# Altium footprint library Resistors.PcbLib: 93 footprints (part 1 of 6)
Each footprint in its own frame and in the unit in brackets; x right, y up, seen from the top. Pads: shape width x height; smd on the part's side, far side on the other; paste and mask are expansions set on the pad; w line width, h text height; cw(c..) or ccw(c..) is an arc to the next point about the centre after c.
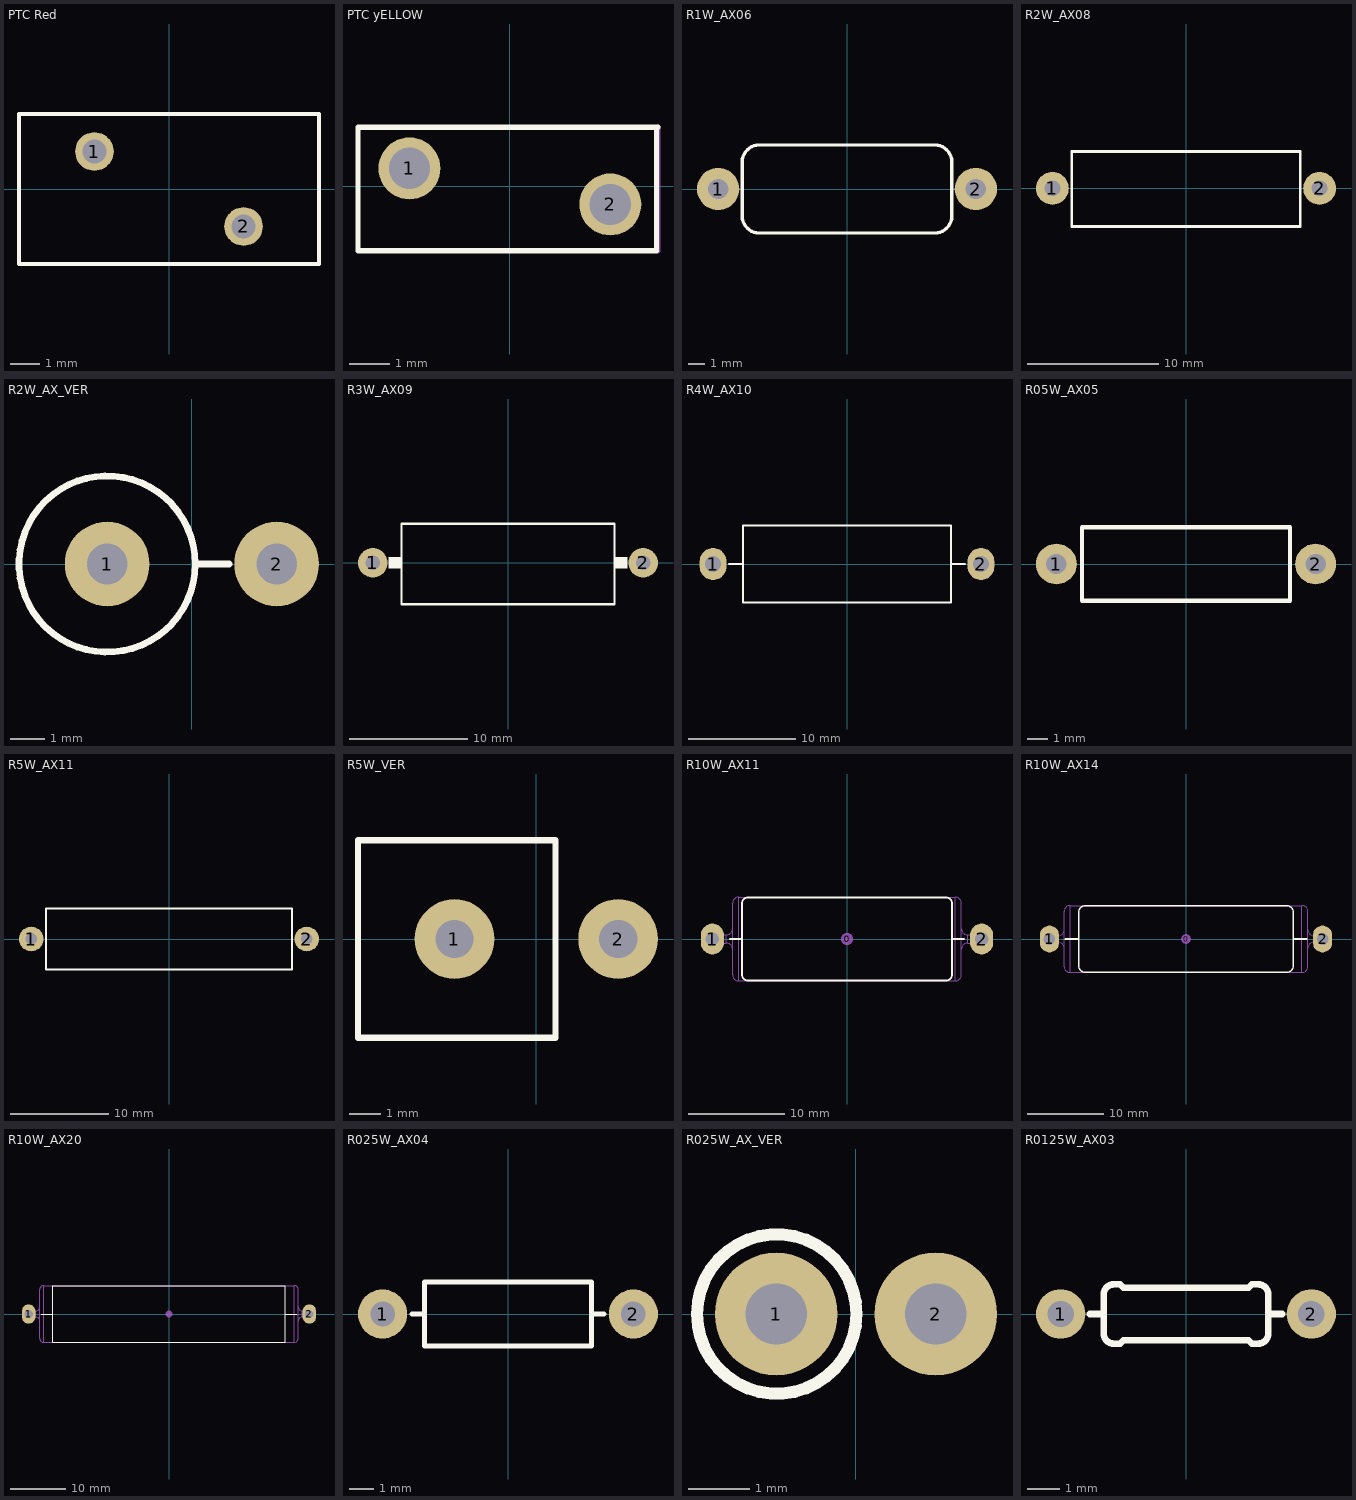
[diagram p0: the footprints below, top view; thin cyan lines are the x and y axes]

## PTC Red [mm]
pads (2):
  round 1.308 hole 0.8: 1(-2.525,1.27) 2(2.525,-1.27)
Top Overlay:
  lines w0.127: -5.08,-2.54 -5.08,2.54 5.08,2.54 5.08,-2.54 -5.08,-2.54
3D body "PTC-RED.step": height 15.3, standoff -25, extent -6.15,-3.3 6.15,3.3

## PTC yELLOW [mm]
pads (2):
  round 1.53 hole 1.02: 1(-2.476,0.445) 2(2.476,-0.445)
Top Overlay:
  lines w0.127: -3.746,1.182 -3.746,-1.587 ; -3.437,1.46 3.619,1.46 3.619,-1.587 -3.746,-1.587 ; 3.654,1.46 -3.746,1.46 -3.746,-1.587
Mechanical 13:
  lines w0.127: 3.654,-1.587 3.654,1.46
3D body "ALSRobot-PTC.step": height 14.81, standoff -3.41, extent -3.747,-0.875 3.653,0.825

## R1W_AX06 [mm] "RESISTOR 1 WATT, AXIAL0.6"
height 5
pads (2):
  round 2.5 hole 1.2: 1(-7.62,0) 2(7.62,0)
Top Overlay:
  lines w0.2: -6.2,-1.6 ccw(c-5.2,-1.6) -5.2,-2.6 5.2,-2.6 ccw(c5.2,-1.6) 6.2,-1.6 6.2,1.6 ccw(c5.2,1.6) 5.2,2.6 -5.2,2.6 ccw(c-5.2,1.6) -6.2,1.6 -6.2,-1.6
3D body "User Library-RES-1W.STEP": height 5, standoff -3, extent -7.97,-2.494 7.97,2.506

## R2W_AX08 [mm] "RESISTOR 2 WATT, AXIAL0.8"
height 5.5
pads (2):
  round 2.5 hole 1.2: 1(-10.16,0) 2(10.16,0)
Top Overlay:
  lines w0.2: -8.7,-2.9 8.7,-2.9 8.7,2.8 -8.7,2.8 -8.7,-2.9
3D body "User Library-RES-2W.STEP": height 5.5, standoff -3, extent -10.51,-2.8 10.51,2.7

## R2W_AX_VER [mm] "RESISTOR 2 WATT, AXIAL0.8"
height 5.5
pads (2):
  round 2.5 hole 1.2: 1(-2.5,0) 2(2.5,0)
Top Overlay:
  circle w0.2: c-2.5,0 r2.6
  lines w0.2: 0.191,0 1.1,0
3D body "User Library-RESAD500W80L1600D500_2W.STEP": height 20.3, standoff -3.1, extent -5,-2.5 2.9,2.5

## R3W_AX09 [mm] "RESISTOR 3 WATT, AXIAL0.9"
height 6.5
pads (2):
  round 2.5 hole 1.2: 1(-11.43,0) 2(11.43,0)
Top Overlay:
  region: 10.1,0.5 9,0.5 9,-0.5 10.1,-0.5
  rectangle: -10.1,-0.5 -9,0.5
  lines w0.2: -9,-3.5 -9,3.3 9,3.3 9,-3.5 -9,-3.5
3D body "User Library-RES-3W.STEP": height 6.5, standoff -3, extent -11.83,-3.3 11.83,3.2

## R4W_AX10 [mm] "RESISTOR 4 WATT, AXIAL1.0"
pads (2):
  oval 2.5x3 hole 1.5: 1(-12.5,0) 2(12.5,0)
Top Overlay:
  lines w0.2: -11,0 -9.7,0 ; 9.7,0 11,0 ; -9.7,-3.6 9.7,-3.6 9.7,3.6 -9.7,3.6 -9.7,-3.6
3D body "User Library-AXIAL_RESISTOR(4W)_HORIZONTAL.step": height 7.21, standoff -3.2, extent -13.1,-3.5 13.1,3.5

## R05W_AX05 [mm] "gRESISTOR 0.5 WATT, AXIAL0.5"
height 3.5
pads (2):
  round 2 hole 1: 1(-6.35,0) 2(6.35,0)
Top Overlay:
  lines w0.2: -5.1,-1.8 5.1,-1.8 5.1,1.8 -5.1,1.8 -5.1,-1.8
3D body "User Library-RES-1_5W.STEP": height 3.5, standoff -3, extent -6.62,-1.75 6.62,1.75

## R5W_AX11 [mm] "RESISTOR 5 WATT, AXIAL1.1"
pads (2):
  round 2.5 hole 1.2: 1(-13.97,0) 2(13.97,0)
Top Overlay:
  lines w0.2: -12.5,-3.1 -12.5,3.1 12.5,3.1 12.5,-3.1 -12.5,-3.1
3D body "User Library-RES-5W.STEP": height 7.01, standoff -5, extent -14.34,-3 14.4,3

## R5W_VER [mm] "RESISTOR 5 WATT, AXIAL1.1"
pads (2):
  round 2.5 hole 1.2: 1(-2.57,0) 2(2.57,0)
Top Overlay:
  lines w0.2: -5.6,-3.1 -5.6,3.1 0.6,3.1 0.6,-3.1 -5.6,-3.1
3D body "User Library-RES-5W-Vert.STEP": height 26.85, standoff -2.75, extent -5.54,-3.006 2.94,3.009

## R10W_AX11 [mm] "RESISTOR 10 WATT, AXIAL1.1"
height 8.712
pads (3):
  round 1.27 on Mech15: 0(0,0)
  oval 2.4x3.2 hole 1.4: 1(-14,0) 2(14,0)
Top Overlay:
  lines w0.2: -12.192,0 -10.922,0 ; 10.922,0 12.192,0 ; -10.922,-3.683 ccw(c-10.287,-3.683) -10.287,-4.318 10.287,-4.318 ccw(c10.287,-3.683) 10.922,-3.683 10.922,3.683 ccw(c10.287,3.683) 10.287,4.318 -10.287,4.318 ccw(c-10.287,3.683) -10.922,3.683 -10.922,-3.683
Mechanical 13:
  lines w0.127: -13.106,-0.432 -13.106,0.432 ; -12.535,-0.429 -12.535,0.432 ; -11.9,-1.067 ccw(c-12.535,-1.067) -12.535,-0.432 -13.97,-0.432 cw(c-13.97,0) -13.97,0.432 -12.535,0.432 ; -11.9,1.067 cw(c-12.535,1.067) -12.535,0.432 ; 11.9,-1.067 cw(c12.535,-1.067) 12.535,-0.432 ; 11.9,1.067 ccw(c12.535,1.067) 12.535,0.432 13.97,0.432 cw(c13.97,0) 13.97,-0.432 12.535,-0.432 ; 12.535,0.429 12.535,-0.432 ; 13.106,-0.432 13.106,0.432 ; -11.265,-4.356 cw(c-11.265,-3.721) -11.9,-3.721 -11.9,3.721 cw(c-11.265,3.721) -11.265,4.356 ; -11.265,-4.356 11.265,-4.356 ; -11.265,-4.356 -11.265,4.356 ; -11.265,4.356 11.265,4.356 ; 11.265,-4.356 ccw(c11.265,-3.721) 11.9,-3.721 11.9,3.721 ccw(c11.265,3.721) 11.265,4.356 ; 11.265,-4.356 11.265,4.356
3D body "Power Res MRA-10.STEP": height 8.7, standoff -2.54, extent -14.402,-4.352 14.402,4.353

## R10W_AX14 [mm] "RESISTOR 10 WATT, AXIAL1.4"
height 8.712
pads (3):
  round 1.27 on Mech15: 0(0,0)
  oval 2.5x3.5 hole 1.5: 1(-17.8,0) 2(17.8,0)
Top Overlay:
  lines w0.2: -15.748,0 -13.97,0 ; 13.97,0 15.748,0 ; -13.97,-3.556 ccw(c-13.208,-3.556) -13.208,-4.318 13.208,-4.318 ccw(c13.208,-3.556) 13.97,-3.556 13.97,3.556 ccw(c13.208,3.556) 13.208,4.318 -13.208,4.318 ccw(c-13.208,3.556) -13.97,3.556 -13.97,-3.556
Mechanical 13:
  lines w0.127: -16.916,-0.432 -16.916,0.432 ; -15.875,-1.194 ccw(c-16.637,-1.194) -16.637,-0.432 ; -15.875,1.194 cw(c-16.637,1.194) -16.637,0.432 ; 15.875,-1.194 cw(c16.637,-1.194) 16.637,-0.432 ; 15.875,1.194 ccw(c16.637,1.194) 16.637,0.432 ; 16.916,-0.432 16.916,0.432 ; -16.637,-0.432 -16.637,0.432 ; -16.637,-0.432 -17.78,-0.432 cw(c-17.78,0) -17.78,0.432 -16.637,0.432 ; -15.113,-4.356 cw(c-15.113,-3.594) -15.875,-3.594 -15.875,3.594 cw(c-15.113,3.594) -15.113,4.356 ; -15.113,-4.356 -15.113,4.356 ; -15.113,-4.356 15.113,-4.356 ; -15.113,4.356 15.113,4.356 ; 15.113,-4.356 ccw(c15.113,-3.594) 15.875,-3.594 15.875,3.594 ccw(c15.113,3.594) 15.113,4.356 ; 15.113,-4.356 15.113,4.356 ; 16.637,-0.432 16.637,0.432 ; 16.637,-0.432 17.78,-0.432 ccw(c17.78,0) 17.78,0.432 16.637,0.432
3D body "Power Res MRA-12.STEP": height 8.69, standoff -2.54, extent -18.212,-4.352 18.212,4.352

## R10W_AX20 [mm] "RESISTOR 10 WATT, AXIAL2.0"
height 10.312
pads (3):
  round 1.27 on Mech15: 0(0,0)
  oval 2.5x3.5 hole 1.5: 1(-25.4,0) 2(25.4,0)
Top Overlay:
  lines w0.2: -23.114,0 -21.082,0 ; 21.082,0 23.114,0 ; -21.082,-5.08 -21.082,5.08 21.082,5.08 21.082,-5.08 -21.082,-5.08
Mechanical 13:
  lines w0.127: -24.333,-0.533 -24.333,0.533 ; -23.393,-1.295 ccw(c-24.155,-1.295) -24.155,-0.533 ; -23.393,1.295 cw(c-24.155,1.295) -24.155,0.533 ; 23.393,-1.295 cw(c24.155,-1.295) 24.155,-0.533 ; 23.393,1.295 ccw(c24.155,1.295) 24.155,0.533 ; 24.333,-0.533 24.333,0.533 ; -24.155,-0.533 -25.4,-0.533 cw(c-25.4,0) -25.4,0.533 -24.155,0.533 ; -24.155,-0.533 -24.155,0.533 ; -22.631,-5.156 cw(c-22.631,-4.394) -23.393,-4.394 -23.393,4.394 cw(c-22.631,4.394) -22.631,5.156 ; -22.631,-5.156 22.631,-5.156 ; -22.631,-5.156 -22.631,5.156 ; -22.631,5.156 22.631,5.156 ; 22.631,-5.156 ccw(c22.631,-4.394) 23.393,-4.394 23.393,4.394 ccw(c22.631,4.394) 22.631,5.156 ; 22.631,-5.156 22.631,5.156 ; 24.155,-0.533 25.4,-0.533 ccw(c25.4,0) 25.4,0.533 24.155,0.533 ; 24.155,-0.533 24.155,0.533
3D body "Power Res RS010.STEP": height 10.31, standoff -2.54, extent -25.933,-5.156 25.933,5.156

## R025W_AX04 [mm] "RESISTOR 1/4 WATT, AXIAL0.4"
pads (2):
  round 2 hole 1: 1(-5.1,0) 2(5.1,0)
Top Overlay:
  lines w0.2: -3.9,0 -3.4,0 ; 3.375,-1.3 -3.4,-1.3 -3.4,1.3 3.375,1.3 ; 3.4,-1.3 3.4,1.3 ; 3.4,0 3.9,0
3D body "RESTH_Axial-0.4.STEP": height 2.6, standoff -2.54, extent -5.38,-1.287 5.38,1.287

## R025W_AX_VER [mm] "RESISTOR 1/4 WATT, AXIAL0.4"
pads (2):
  round 2 hole 1: 1(-1.3,0) 2(1.3,0)
Top Overlay:
  circle w0.2: c-1.29,0 r1.3
3D body "User Library-RESAD250W60L650D230_0_25W.STEP": height 9.83, standoff -2.47, extent -2.432,-1.15 1.51,1.15

## R0125W_AX03 [mm] "RESISTOR 1/8 WATT, AXIAL0.3 INCH SPACING"
pads (2):
  round 1.5 hole 0.8: 1(-3.81,0) 2(3.81,0)
Top Overlay:
  lines w0.2: -2.921,0 -2.5,0 ; 2.5,0 2.921,0 ; -2.5,-0.6 ccw(c-2.2,-0.6) -2.2,-0.9 -2,-0.9 -1.9,-0.8 1.9,-0.8 2,-0.9 2.2,-0.9 ccw(c2.2,-0.6) 2.5,-0.6 2.5,0.6 ccw(c2.2,0.6) 2.2,0.9 2,0.9 1.9,0.8 -1.9,0.8 -2,0.9 -2.2,0.9 ccw(c-2.2,0.6) -2.5,0.6 -2.5,-0.6
3D body "1M.STEP": height 1.85, standoff -3, extent -4.16,-0.85 4.16,0.85